# Altium footprint library hphonglib.PcbLib: 703 footprints (part 11 of 44)
Each footprint in its own frame and in the unit in brackets; x right, y up, seen from the top. Pads: shape width x height; smd on the part's side, far side on the other; paste and mask are expansions set on the pad; w line width, h text height; cw(c..) or ccw(c..) is an arc to the next point about the centre after c.
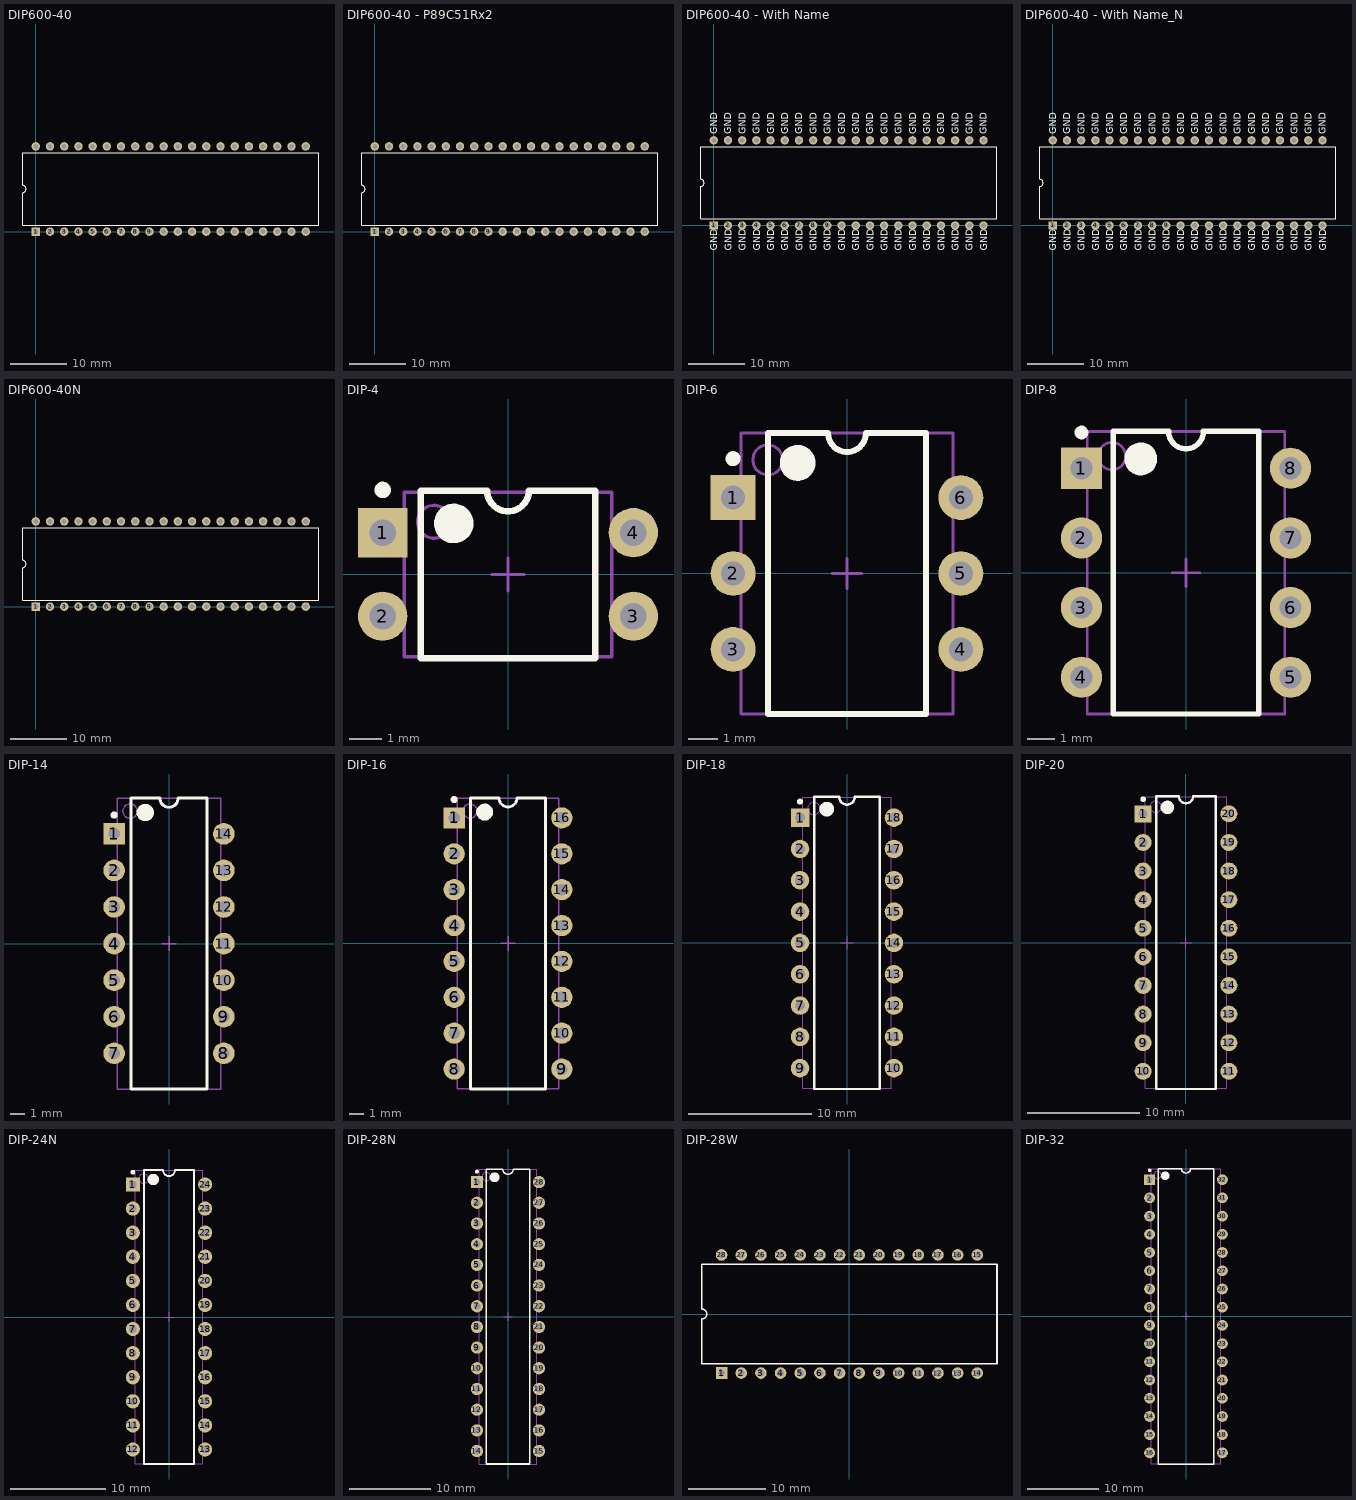
[diagram p10: the footprints below, top view; thin cyan lines are the x and y axes]

## DIP600-40 [mm] "DIP, Plastic; 40 Leads; Row Spacing 15.24 mm; Pitch 2.54 mm"
height 4.83
pads (40):
  rect 1.5x1.5 hole 0.9: 1(0,0)
  round 1.5 hole 0.9: 2(2.54,0) 3(5.08,0) 4(7.62,0) 5(10.16,0) 6(12.7,0) 7(15.24,0) 8(17.78,0) 9(20.32,0) 10(22.86,0) 11(25.4,0) 12(27.94,0) 13(30.48,0) 14(33.02,0) 15(35.56,0) 16(38.1,0) 17(40.64,0) 18(43.18,0) 19(45.72,0) 20(48.26,0) 21(48.26,15.24) 22(45.72,15.24) 23(43.18,15.24) 24(40.64,15.24) 25(38.1,15.24) 26(35.56,15.24) 27(33.02,15.24) 28(30.48,15.24) 29(27.94,15.24) 30(25.4,15.24) 31(22.86,15.24) 32(20.32,15.24) 33(17.78,15.24) 34(15.24,15.24) 35(12.7,15.24) 36(10.16,15.24) 37(7.62,15.24) 38(5.08,15.24) 39(2.54,15.24) 40(0,15.24)
Top Overlay:
  lines w0.2: -2.37,1.17 -2.37,6.985 ccw(c-2.37,7.62) -2.37,8.255 -2.37,14.07 50.63,14.07 50.63,1.17 -2.37,1.17
3D body: height 3, standoff 2.65, extent 6.87,13.54 8.37,15.24
3D body: height 3, standoff 0.5, extent 6.87,15.065 8.37,15.415
3D body: height 0.5, standoff -3.8, extent 7.345,15.065 7.895,15.415
3D body: height 3, standoff 2.65, extent 4.33,13.54 5.83,15.24
3D body: height 3, standoff 0.5, extent 4.33,15.065 5.83,15.415
3D body: height 0.5, standoff -3.8, extent 4.805,15.065 5.355,15.415
3D body: height 3, standoff 2.65, extent 1.79,13.54 3.29,15.24
3D body: height 3, standoff 0.5, extent 1.79,15.065 3.29,15.415
3D body: height 0.5, standoff -3.8, extent 2.265,15.065 2.815,15.415
3D body: height 3, standoff 2.65, extent -0.75,13.54 0.75,15.24
3D body: height 3, standoff 0.5, extent -0.75,15.065 0.75,15.415
3D body: height 0.5, standoff -3.8, extent -0.275,15.065 0.275,15.415
3D body: height 3, standoff 2.65, extent 17.03,13.54 18.53,15.24
3D body: height 3, standoff 0.5, extent 17.03,15.065 18.53,15.415
3D body: height 0.5, standoff -3.8, extent 17.505,15.065 18.055,15.415
3D body: height 3, standoff 2.65, extent 14.49,13.54 15.99,15.24
3D body: height 3, standoff 0.5, extent 14.49,15.065 15.99,15.415
3D body: height 0.5, standoff -3.8, extent 14.965,15.065 15.515,15.415
3D body: height 3, standoff 2.65, extent 11.95,13.54 13.45,15.24
3D body: height 3, standoff 0.5, extent 11.95,15.065 13.45,15.415
3D body: height 0.5, standoff -3.8, extent 12.425,15.065 12.975,15.415
3D body: height 3, standoff 2.65, extent 9.41,13.54 10.91,15.24
3D body: height 3, standoff 0.5, extent 9.41,15.065 10.91,15.415
3D body: height 0.5, standoff -3.8, extent 9.885,15.065 10.435,15.415
3D body: height 3, standoff 2.65, extent 27.19,13.54 28.69,15.24
3D body: height 3, standoff 0.5, extent 27.19,15.065 28.69,15.415
3D body: height 0.5, standoff -3.8, extent 27.665,15.065 28.215,15.415
3D body: height 3, standoff 2.65, extent 24.65,13.54 26.15,15.24
3D body: height 3, standoff 0.5, extent 24.65,15.065 26.15,15.415
3D body: height 0.5, standoff -3.8, extent 25.125,15.065 25.675,15.415
3D body: height 3, standoff 2.65, extent 22.11,13.54 23.61,15.24
3D body: height 3, standoff 0.5, extent 22.11,15.065 23.61,15.415
3D body: height 0.5, standoff -3.8, extent 22.585,15.065 23.135,15.415
3D body: height 3, standoff 2.65, extent 19.57,13.54 21.07,15.24
3D body: height 3, standoff 0.5, extent 19.57,15.065 21.07,15.415
3D body: height 0.5, standoff -3.8, extent 20.045,15.065 20.595,15.415
3D body: height 3, standoff 2.65, extent 37.35,13.54 38.85,15.24
3D body: height 3, standoff 0.5, extent 37.35,15.065 38.85,15.415
3D body: height 0.5, standoff -3.8, extent 37.825,15.065 38.375,15.415
3D body: height 3, standoff 2.65, extent 34.81,13.54 36.31,15.24
3D body: height 3, standoff 0.5, extent 34.81,15.065 36.31,15.415
3D body: height 0.5, standoff -3.8, extent 35.285,15.065 35.835,15.415
3D body: height 3, standoff 2.65, extent 32.27,13.54 33.77,15.24
3D body: height 3, standoff 0.5, extent 32.27,15.065 33.77,15.415
3D body: height 0.5, standoff -3.8, extent 32.745,15.065 33.295,15.415
3D body: height 3, standoff 2.65, extent 29.73,13.54 31.23,15.24
3D body: height 3, standoff 0.5, extent 29.73,15.065 31.23,15.415
3D body: height 0.5, standoff -3.8, extent 30.205,15.065 30.755,15.415
3D body: height 3, standoff 2.65, extent 47.51,13.54 49.01,15.24
3D body: height 3, standoff 0.5, extent 47.51,15.065 49.01,15.415
3D body: height 0.5, standoff -3.8, extent 47.985,15.065 48.535,15.415
3D body: height 3, standoff 2.65, extent 44.97,13.54 46.47,15.24
3D body: height 3, standoff 0.5, extent 44.97,15.065 46.47,15.415
3D body: height 0.5, standoff -3.8, extent 45.445,15.065 45.995,15.415
3D body: height 3, standoff 2.65, extent 42.43,13.54 43.93,15.24
3D body: height 3, standoff 0.5, extent 42.43,15.065 43.93,15.415
3D body: height 0.5, standoff -3.8, extent 42.905,15.065 43.455,15.415
3D body: height 3, standoff 2.65, extent 39.89,13.54 41.39,15.24
3D body: height 3, standoff 0.5, extent 39.89,15.065 41.39,15.415
3D body: height 0.5, standoff -3.8, extent 40.365,15.065 40.915,15.415
3D body: height 3, standoff 2.65, extent 39.89,0 41.39,1.7
3D body: height 3, standoff 0.5, extent 39.89,-0.175 41.39,0.175
3D body: height 0.5, standoff -3.8, extent 40.365,-0.175 40.915,0.175
3D body: height 3, standoff 2.65, extent 42.43,0 43.93,1.7
3D body: height 3, standoff 0.5, extent 42.43,-0.175 43.93,0.175
3D body: height 0.5, standoff -3.8, extent 42.905,-0.175 43.455,0.175
3D body: height 3, standoff 2.65, extent 44.97,0 46.47,1.7
3D body: height 3, standoff 0.5, extent 44.97,-0.175 46.47,0.175
3D body: height 0.5, standoff -3.8, extent 45.445,-0.175 45.995,0.175
3D body: height 3, standoff 2.65, extent 47.51,0 49.01,1.7
3D body: height 3, standoff 0.5, extent 47.51,-0.175 49.01,0.175
3D body: height 0.5, standoff -3.8, extent 47.985,-0.175 48.535,0.175
3D body: height 3, standoff 2.65, extent 29.73,0 31.23,1.7
3D body: height 3, standoff 0.5, extent 29.73,-0.175 31.23,0.175
3D body: height 0.5, standoff -3.8, extent 30.205,-0.175 30.755,0.175
3D body: height 3, standoff 2.65, extent 32.27,0 33.77,1.7
3D body: height 3, standoff 0.5, extent 32.27,-0.175 33.77,0.175
3D body: height 0.5, standoff -3.8, extent 32.745,-0.175 33.295,0.175
3D body: height 3, standoff 2.65, extent 34.81,0 36.31,1.7
3D body: height 3, standoff 0.5, extent 34.81,-0.175 36.31,0.175
3D body: height 0.5, standoff -3.8, extent 35.285,-0.175 35.835,0.175
3D body: height 3, standoff 2.65, extent 37.35,0 38.85,1.7
3D body: height 3, standoff 0.5, extent 37.35,-0.175 38.85,0.175
3D body: height 0.5, standoff -3.8, extent 37.825,-0.175 38.375,0.175
3D body: height 3, standoff 2.65, extent 19.57,0 21.07,1.7
3D body: height 3, standoff 0.5, extent 19.57,-0.175 21.07,0.175
3D body: height 0.5, standoff -3.8, extent 20.045,-0.175 20.595,0.175
3D body: height 3, standoff 2.65, extent 22.11,0 23.61,1.7
3D body: height 3, standoff 0.5, extent 22.11,-0.175 23.61,0.175
3D body: height 0.5, standoff -3.8, extent 22.585,-0.175 23.135,0.175
3D body: height 3, standoff 2.65, extent 24.65,0 26.15,1.7
3D body: height 3, standoff 0.5, extent 24.65,-0.175 26.15,0.175
3D body: height 0.5, standoff -3.8, extent 25.125,-0.175 25.675,0.175
3D body: height 3, standoff 2.65, extent 27.19,0 28.69,1.7
3D body: height 3, standoff 0.5, extent 27.19,-0.175 28.69,0.175
3D body: height 0.5, standoff -3.8, extent 27.665,-0.175 28.215,0.175
3D body: height 3, standoff 2.65, extent 9.41,0 10.91,1.7
3D body: height 3, standoff 0.5, extent 9.41,-0.175 10.91,0.175
3D body: height 0.5, standoff -3.8, extent 9.885,-0.175 10.435,0.175
3D body: height 3, standoff 2.65, extent 11.95,0 13.45,1.7
3D body: height 3, standoff 0.5, extent 11.95,-0.175 13.45,0.175
3D body: height 0.5, standoff -3.8, extent 12.425,-0.175 12.975,0.175
3D body: height 3, standoff 2.65, extent 14.49,0 15.99,1.7
3D body: height 3, standoff 0.5, extent 14.49,-0.175 15.99,0.175
3D body: height 0.5, standoff -3.8, extent 14.965,-0.175 15.515,0.175
3D body: height 3, standoff 2.65, extent 17.03,0 18.53,1.7
3D body: height 3, standoff 0.5, extent 17.03,-0.175 18.53,0.175
3D body: height 0.5, standoff -3.8, extent 17.505,-0.175 18.055,0.175
3D body: height 0.5, standoff -3.8, extent 7.345,-0.175 7.895,0.175
3D body: height 3, standoff 0.5, extent 6.87,-0.175 8.37,0.175
3D body: height 3, standoff 2.65, extent 6.87,0 8.37,1.7
3D body: height 0.5, standoff -3.8, extent 4.805,-0.175 5.355,0.175
3D body: height 3, standoff 0.5, extent 4.33,-0.175 5.83,0.175
3D body: height 3, standoff 2.65, extent 4.33,0 5.83,1.7
3D body: height 0.5, standoff -3.8, extent 2.265,-0.175 2.815,0.175
3D body: height 3, standoff 0.5, extent 1.79,-0.175 3.29,0.175
3D body: height 3, standoff 2.65, extent 1.79,0 3.29,1.7
3D body: height 0.5, standoff -3.8, extent -0.275,-0.175 0.275,0.175
3D body: height 3, standoff 0.5, extent -0.75,-0.175 0.75,0.175
3D body: height 3, standoff 2.65, extent -0.75,0 0.75,1.7
3D body: height 5.3, standoff 0.3, extent -2.3,1.25 50.65,14
3D body: height 5.4, standoff 4, extent -2.325,6.621 -1.316,8.638

## DIP600-40 - P89C51Rx2 [mm] "DIP, Plastic; 40 Leads; Row Spacing 15.24 mm; Pitch 2.54 mm"
height 4.83
pads (40):
  rect 1.5x1.5 hole 0.9: 1(0,0)
  round 1.5 hole 0.9: 2(2.54,0) 3(5.08,0) 4(7.62,0) 5(10.16,0) 6(12.7,0) 7(15.24,0) 8(17.78,0) 9(20.32,0) 10(22.86,0) 11(25.4,0) 12(27.94,0) 13(30.48,0) 14(33.02,0) 15(35.56,0) 16(38.1,0) 17(40.64,0) 18(43.18,0) 19(45.72,0) 20(48.26,0) 21(48.26,15.24) 22(45.72,15.24) 23(43.18,15.24) 24(40.64,15.24) 25(38.1,15.24) 26(35.56,15.24) 27(33.02,15.24) 28(30.48,15.24) 29(27.94,15.24) 30(25.4,15.24) 31(22.86,15.24) 32(20.32,15.24) 33(17.78,15.24) 34(15.24,15.24) 35(12.7,15.24) 36(10.16,15.24) 37(7.62,15.24) 38(5.08,15.24) 39(2.54,15.24) 40(0,15.24)
Top Overlay:
  lines w0.2: -2.37,1.17 -2.37,6.985 ccw(c-2.37,7.62) -2.37,8.255 -2.37,14.07 50.63,14.07 50.63,1.17 -2.37,1.17
3D body: height 3, standoff 2.65, extent 6.87,13.54 8.37,15.24
3D body: height 3, standoff 0.5, extent 6.87,15.065 8.37,15.415
3D body: height 0.5, standoff -3.8, extent 7.345,15.065 7.895,15.415
3D body: height 3, standoff 2.65, extent 4.33,13.54 5.83,15.24
3D body: height 3, standoff 0.5, extent 4.33,15.065 5.83,15.415
3D body: height 0.5, standoff -3.8, extent 4.805,15.065 5.355,15.415
3D body: height 3, standoff 2.65, extent 1.79,13.54 3.29,15.24
3D body: height 3, standoff 0.5, extent 1.79,15.065 3.29,15.415
3D body: height 0.5, standoff -3.8, extent 2.265,15.065 2.815,15.415
3D body: height 3, standoff 2.65, extent -0.75,13.54 0.75,15.24
3D body: height 3, standoff 0.5, extent -0.75,15.065 0.75,15.415
3D body: height 0.5, standoff -3.8, extent -0.275,15.065 0.275,15.415
3D body: height 3, standoff 2.65, extent 17.03,13.54 18.53,15.24
3D body: height 3, standoff 0.5, extent 17.03,15.065 18.53,15.415
3D body: height 0.5, standoff -3.8, extent 17.505,15.065 18.055,15.415
3D body: height 3, standoff 2.65, extent 14.49,13.54 15.99,15.24
3D body: height 3, standoff 0.5, extent 14.49,15.065 15.99,15.415
3D body: height 0.5, standoff -3.8, extent 14.965,15.065 15.515,15.415
3D body: height 3, standoff 2.65, extent 11.95,13.54 13.45,15.24
3D body: height 3, standoff 0.5, extent 11.95,15.065 13.45,15.415
3D body: height 0.5, standoff -3.8, extent 12.425,15.065 12.975,15.415
3D body: height 3, standoff 2.65, extent 9.41,13.54 10.91,15.24
3D body: height 3, standoff 0.5, extent 9.41,15.065 10.91,15.415
3D body: height 0.5, standoff -3.8, extent 9.885,15.065 10.435,15.415
3D body: height 3, standoff 2.65, extent 27.19,13.54 28.69,15.24
3D body: height 3, standoff 0.5, extent 27.19,15.065 28.69,15.415
3D body: height 0.5, standoff -3.8, extent 27.665,15.065 28.215,15.415
3D body: height 3, standoff 2.65, extent 24.65,13.54 26.15,15.24
3D body: height 3, standoff 0.5, extent 24.65,15.065 26.15,15.415
3D body: height 0.5, standoff -3.8, extent 25.125,15.065 25.675,15.415
3D body: height 3, standoff 2.65, extent 22.11,13.54 23.61,15.24
3D body: height 3, standoff 0.5, extent 22.11,15.065 23.61,15.415
3D body: height 0.5, standoff -3.8, extent 22.585,15.065 23.135,15.415
3D body: height 3, standoff 2.65, extent 19.57,13.54 21.07,15.24
3D body: height 3, standoff 0.5, extent 19.57,15.065 21.07,15.415
3D body: height 0.5, standoff -3.8, extent 20.045,15.065 20.595,15.415
3D body: height 3, standoff 2.65, extent 37.35,13.54 38.85,15.24
3D body: height 3, standoff 0.5, extent 37.35,15.065 38.85,15.415
3D body: height 0.5, standoff -3.8, extent 37.825,15.065 38.375,15.415
3D body: height 3, standoff 2.65, extent 34.81,13.54 36.31,15.24
3D body: height 3, standoff 0.5, extent 34.81,15.065 36.31,15.415
3D body: height 0.5, standoff -3.8, extent 35.285,15.065 35.835,15.415
3D body: height 3, standoff 2.65, extent 32.27,13.54 33.77,15.24
3D body: height 3, standoff 0.5, extent 32.27,15.065 33.77,15.415
3D body: height 0.5, standoff -3.8, extent 32.745,15.065 33.295,15.415
3D body: height 3, standoff 2.65, extent 29.73,13.54 31.23,15.24
3D body: height 3, standoff 0.5, extent 29.73,15.065 31.23,15.415
3D body: height 0.5, standoff -3.8, extent 30.205,15.065 30.755,15.415
3D body: height 3, standoff 2.65, extent 47.51,13.54 49.01,15.24
3D body: height 3, standoff 0.5, extent 47.51,15.065 49.01,15.415
3D body: height 0.5, standoff -3.8, extent 47.985,15.065 48.535,15.415
3D body: height 3, standoff 2.65, extent 44.97,13.54 46.47,15.24
3D body: height 3, standoff 0.5, extent 44.97,15.065 46.47,15.415
3D body: height 0.5, standoff -3.8, extent 45.445,15.065 45.995,15.415
3D body: height 3, standoff 2.65, extent 42.43,13.54 43.93,15.24
3D body: height 3, standoff 0.5, extent 42.43,15.065 43.93,15.415
3D body: height 0.5, standoff -3.8, extent 42.905,15.065 43.455,15.415
3D body: height 3, standoff 2.65, extent 39.89,13.54 41.39,15.24
3D body: height 3, standoff 0.5, extent 39.89,15.065 41.39,15.415
3D body: height 0.5, standoff -3.8, extent 40.365,15.065 40.915,15.415
3D body: height 3, standoff 2.65, extent 39.89,0 41.39,1.7
3D body: height 3, standoff 0.5, extent 39.89,-0.175 41.39,0.175
3D body: height 0.5, standoff -3.8, extent 40.365,-0.175 40.915,0.175
3D body: height 3, standoff 2.65, extent 42.43,0 43.93,1.7
3D body: height 3, standoff 0.5, extent 42.43,-0.175 43.93,0.175
3D body: height 0.5, standoff -3.8, extent 42.905,-0.175 43.455,0.175
3D body: height 3, standoff 2.65, extent 44.97,0 46.47,1.7
3D body: height 3, standoff 0.5, extent 44.97,-0.175 46.47,0.175
3D body: height 0.5, standoff -3.8, extent 45.445,-0.175 45.995,0.175
3D body: height 3, standoff 2.65, extent 47.51,0 49.01,1.7
3D body: height 3, standoff 0.5, extent 47.51,-0.175 49.01,0.175
3D body: height 0.5, standoff -3.8, extent 47.985,-0.175 48.535,0.175
3D body: height 3, standoff 2.65, extent 29.73,0 31.23,1.7
3D body: height 3, standoff 0.5, extent 29.73,-0.175 31.23,0.175
3D body: height 0.5, standoff -3.8, extent 30.205,-0.175 30.755,0.175
3D body: height 3, standoff 2.65, extent 32.27,0 33.77,1.7
3D body: height 3, standoff 0.5, extent 32.27,-0.175 33.77,0.175
3D body: height 0.5, standoff -3.8, extent 32.745,-0.175 33.295,0.175
3D body: height 3, standoff 2.65, extent 34.81,0 36.31,1.7
3D body: height 3, standoff 0.5, extent 34.81,-0.175 36.31,0.175
3D body: height 0.5, standoff -3.8, extent 35.285,-0.175 35.835,0.175
3D body: height 3, standoff 2.65, extent 37.35,0 38.85,1.7
3D body: height 3, standoff 0.5, extent 37.35,-0.175 38.85,0.175
3D body: height 0.5, standoff -3.8, extent 37.825,-0.175 38.375,0.175
3D body: height 3, standoff 2.65, extent 19.57,0 21.07,1.7
3D body: height 3, standoff 0.5, extent 19.57,-0.175 21.07,0.175
3D body: height 0.5, standoff -3.8, extent 20.045,-0.175 20.595,0.175
3D body: height 3, standoff 2.65, extent 22.11,0 23.61,1.7
3D body: height 3, standoff 0.5, extent 22.11,-0.175 23.61,0.175
3D body: height 0.5, standoff -3.8, extent 22.585,-0.175 23.135,0.175
3D body: height 3, standoff 2.65, extent 24.65,0 26.15,1.7
3D body: height 3, standoff 0.5, extent 24.65,-0.175 26.15,0.175
3D body: height 0.5, standoff -3.8, extent 25.125,-0.175 25.675,0.175
3D body: height 3, standoff 2.65, extent 27.19,0 28.69,1.7
3D body: height 3, standoff 0.5, extent 27.19,-0.175 28.69,0.175
3D body: height 0.5, standoff -3.8, extent 27.665,-0.175 28.215,0.175
3D body: height 3, standoff 2.65, extent 9.41,0 10.91,1.7
3D body: height 3, standoff 0.5, extent 9.41,-0.175 10.91,0.175
3D body: height 0.5, standoff -3.8, extent 9.885,-0.175 10.435,0.175
3D body: height 3, standoff 2.65, extent 11.95,0 13.45,1.7
3D body: height 3, standoff 0.5, extent 11.95,-0.175 13.45,0.175
3D body: height 0.5, standoff -3.8, extent 12.425,-0.175 12.975,0.175
3D body: height 3, standoff 2.65, extent 14.49,0 15.99,1.7
3D body: height 3, standoff 0.5, extent 14.49,-0.175 15.99,0.175
3D body: height 0.5, standoff -3.8, extent 14.965,-0.175 15.515,0.175
3D body: height 3, standoff 2.65, extent 17.03,0 18.53,1.7
3D body: height 3, standoff 0.5, extent 17.03,-0.175 18.53,0.175
3D body: height 0.5, standoff -3.8, extent 17.505,-0.175 18.055,0.175
3D body: height 0.5, standoff -3.8, extent 7.345,-0.175 7.895,0.175
3D body: height 3, standoff 0.5, extent 6.87,-0.175 8.37,0.175
3D body: height 3, standoff 2.65, extent 6.87,0 8.37,1.7
3D body: height 0.5, standoff -3.8, extent 4.805,-0.175 5.355,0.175
3D body: height 3, standoff 0.5, extent 4.33,-0.175 5.83,0.175
3D body: height 3, standoff 2.65, extent 4.33,0 5.83,1.7
3D body: height 0.5, standoff -3.8, extent 2.265,-0.175 2.815,0.175
3D body: height 3, standoff 0.5, extent 1.79,-0.175 3.29,0.175
3D body: height 3, standoff 2.65, extent 1.79,0 3.29,1.7
3D body: height 0.5, standoff -3.8, extent -0.275,-0.175 0.275,0.175
3D body: height 3, standoff 0.5, extent -0.75,-0.175 0.75,0.175
3D body: height 3, standoff 2.65, extent -0.75,0 0.75,1.7
3D body: height 5.3, standoff 0.3, extent -2.3,1.25 50.65,14
3D body: height 5.4, standoff 4, extent -2.325,6.621 -1.316,8.638

## DIP600-40 - With Name [mm] "DIP, Plastic; 40 Leads; Row Spacing 15.24 mm; Pitch 2.54 mm"
height 4.83
pads (40):
  rect 1.5x1.5 hole 0.9: 1(0,0)
  round 1.5 hole 0.9: 2(2.54,0) 3(5.08,0) 4(7.62,0) 5(10.16,0) 6(12.7,0) 7(15.24,0) 8(17.78,0) 9(20.32,0) 10(22.86,0) 11(25.4,0) 12(27.94,0) 13(30.48,0) 14(33.02,0) 15(35.56,0) 16(38.1,0) 17(40.64,0) 18(43.18,0) 19(45.72,0) 20(48.26,0) 21(48.26,15.24) 22(45.72,15.24) 23(43.18,15.24) 24(40.64,15.24) 25(38.1,15.24) 26(35.56,15.24) 27(33.02,15.24) 28(30.48,15.24) 29(27.94,15.24) 30(25.4,15.24) 31(22.86,15.24) 32(20.32,15.24) 33(17.78,15.24) 34(15.24,15.24) 35(12.7,15.24) 36(10.16,15.24) 37(7.62,15.24) 38(5.08,15.24) 39(2.54,15.24) 40(0,15.24)
Top Overlay:
  lines w0.2: -2.37,1.17 -2.37,6.985 ccw(c-2.37,7.62) -2.37,8.255 -2.37,14.07 50.63,14.07 50.63,1.17 -2.37,1.17
  text "GND" at 31.13,-4.565 h1.27
  text "GND" at 33.67,-4.565 h1.27
  text "GND" at 38.75,-4.565 h1.27
  text "GND" at 36.21,-4.565 h1.27
  text "GND" at 41.29,-4.565 h1.27
  text "GND" at 43.83,-4.565 h1.27
  text "GND" at 48.91,-4.565 h1.27
  text "GND" at 46.37,-4.565 h1.27
  text "GND" at 20.97,-4.565 h1.27
  text "GND" at 23.51,-4.565 h1.27
  text "GND" at 28.59,-4.565 h1.27
  text "GND" at 26.05,-4.565 h1.27
  text "GND" at 10.81,-4.565 h1.27
  text "GND" at 13.35,-4.565 h1.27
  text "GND" at 18.43,-4.565 h1.27
  text "GND" at 15.89,-4.565 h1.27
  text "GND" at 0.65,-4.565 h1.27
  text "GND" at 3.19,-4.565 h1.27
  text "GND" at 8.27,-4.565 h1.27
  text "GND" at 5.73,-4.565 h1.27
  text "GND" at 41.265,16.35 h1.27
  text "GND" at 43.805,16.35 h1.27
  text "GND" at 48.885,16.35 h1.27
  text "GND" at 46.345,16.35 h1.27
  text "GND" at 31.105,16.35 h1.27
  text "GND" at 33.645,16.35 h1.27
  text "GND" at 38.725,16.35 h1.27
  text "GND" at 36.185,16.35 h1.27
  text "GND" at 20.945,16.35 h1.27
  text "GND" at 23.485,16.35 h1.27
  text "GND" at 28.565,16.35 h1.27
  text "GND" at 26.025,16.35 h1.27
  text "GND" at 10.785,16.35 h1.27
  text "GND" at 13.325,16.35 h1.27
  text "GND" at 18.405,16.35 h1.27
  text "GND" at 15.865,16.35 h1.27
  text "GND" at 5.705,16.35 h1.27
  text "GND" at 8.245,16.35 h1.27
  text "GND" at 3.165,16.35 h1.27
  text "GND" at 0.625,16.35 h1.27
Bottom Overlay:
  lines w0.254: -2.525,-1.025 -2.525,16.35 50.675,16.35 50.675,-1.025 -2.525,-1.025
  text "GND" at 1.955,-4.85 h1.27
  text "GND" at -0.585,-4.85 h1.27
  text "GND" at 9.575,-4.85 h1.27
  text "GND" at 7.035,-4.85 h1.27
  text "GND" at 4.495,-4.85 h1.27
  text "GND" at 17.195,-4.85 h1.27
  text "GND" at 14.655,-4.85 h1.27
  text "GND" at 12.115,-4.85 h1.27
  text "GND" at 24.815,-4.85 h1.27
  text "GND" at 22.275,-4.85 h1.27
  text "GND" at 19.735,-4.85 h1.27
  text "GND" at 32.435,-4.85 h1.27
  text "GND" at 29.895,-4.85 h1.27
  text "GND" at 27.355,-4.85 h1.27
  text "GND" at 40.055,-4.85 h1.27
  text "GND" at 37.515,-4.85 h1.27
  text "GND" at 34.975,-4.85 h1.27
  text "GND" at 42.595,-4.85 h1.27
  text "GND" at 45.135,-4.85 h1.27
  text "GND" at 47.675,-4.85 h1.27
  text "GND" at 46.325,20.15 h1.27
  text "GND" at 48.825,20.125 h1.27
  text "GND" at 38.65,20.15 h1.27
  text "GND" at 41.19,20.15 h1.27
  text "GND" at 43.73,20.15 h1.27
  text "GND" at 31.03,20.15 h1.27
  text "GND" at 33.57,20.15 h1.27
  text "GND" at 36.11,20.15 h1.27
  text "GND" at 23.41,20.15 h1.27
  text "GND" at 25.95,20.15 h1.27
  text "GND" at 28.49,20.15 h1.27
  text "GND" at 15.79,20.15 h1.27
  text "GND" at 18.33,20.15 h1.27
  text "GND" at 20.87,20.15 h1.27
  text "GND" at 8.17,20.15 h1.27
  text "GND" at 10.71,20.15 h1.27
  text "GND" at 13.25,20.15 h1.27
  text "GND" at 5.63,20.15 h1.27
  text "GND" at 3.09,20.15 h1.27
  text "GND" at 0.55,20.15 h1.27
3D body: height 3, standoff 2.65, extent 6.87,13.54 8.37,15.24
3D body: height 3, standoff 0.5, extent 6.87,15.065 8.37,15.415
3D body: height 0.5, standoff -3.8, extent 7.345,15.065 7.895,15.415
3D body: height 3, standoff 2.65, extent 4.33,13.54 5.83,15.24
3D body: height 3, standoff 0.5, extent 4.33,15.065 5.83,15.415
3D body: height 0.5, standoff -3.8, extent 4.805,15.065 5.355,15.415
3D body: height 3, standoff 2.65, extent 1.79,13.54 3.29,15.24
3D body: height 3, standoff 0.5, extent 1.79,15.065 3.29,15.415
3D body: height 0.5, standoff -3.8, extent 2.265,15.065 2.815,15.415
3D body: height 3, standoff 2.65, extent -0.75,13.54 0.75,15.24
3D body: height 3, standoff 0.5, extent -0.75,15.065 0.75,15.415
3D body: height 0.5, standoff -3.8, extent -0.275,15.065 0.275,15.415
3D body: height 3, standoff 2.65, extent 17.03,13.54 18.53,15.24
3D body: height 3, standoff 0.5, extent 17.03,15.065 18.53,15.415
3D body: height 0.5, standoff -3.8, extent 17.505,15.065 18.055,15.415
3D body: height 3, standoff 2.65, extent 14.49,13.54 15.99,15.24
3D body: height 3, standoff 0.5, extent 14.49,15.065 15.99,15.415
3D body: height 0.5, standoff -3.8, extent 14.965,15.065 15.515,15.415
3D body: height 3, standoff 2.65, extent 11.95,13.54 13.45,15.24
3D body: height 3, standoff 0.5, extent 11.95,15.065 13.45,15.415
3D body: height 0.5, standoff -3.8, extent 12.425,15.065 12.975,15.415
3D body: height 3, standoff 2.65, extent 9.41,13.54 10.91,15.24
3D body: height 3, standoff 0.5, extent 9.41,15.065 10.91,15.415
3D body: height 0.5, standoff -3.8, extent 9.885,15.065 10.435,15.415
3D body: height 3, standoff 2.65, extent 27.19,13.54 28.69,15.24
3D body: height 3, standoff 0.5, extent 27.19,15.065 28.69,15.415
3D body: height 0.5, standoff -3.8, extent 27.665,15.065 28.215,15.415
3D body: height 3, standoff 2.65, extent 24.65,13.54 26.15,15.24
3D body: height 3, standoff 0.5, extent 24.65,15.065 26.15,15.415
3D body: height 0.5, standoff -3.8, extent 25.125,15.065 25.675,15.415
3D body: height 3, standoff 2.65, extent 22.11,13.54 23.61,15.24
3D body: height 3, standoff 0.5, extent 22.11,15.065 23.61,15.415
3D body: height 0.5, standoff -3.8, extent 22.585,15.065 23.135,15.415
3D body: height 3, standoff 2.65, extent 19.57,13.54 21.07,15.24
3D body: height 3, standoff 0.5, extent 19.57,15.065 21.07,15.415
3D body: height 0.5, standoff -3.8, extent 20.045,15.065 20.595,15.415
3D body: height 3, standoff 2.65, extent 37.35,13.54 38.85,15.24
3D body: height 3, standoff 0.5, extent 37.35,15.065 38.85,15.415
3D body: height 0.5, standoff -3.8, extent 37.825,15.065 38.375,15.415
3D body: height 3, standoff 2.65, extent 34.81,13.54 36.31,15.24
3D body: height 3, standoff 0.5, extent 34.81,15.065 36.31,15.415
3D body: height 0.5, standoff -3.8, extent 35.285,15.065 35.835,15.415
3D body: height 3, standoff 2.65, extent 32.27,13.54 33.77,15.24
3D body: height 3, standoff 0.5, extent 32.27,15.065 33.77,15.415
3D body: height 0.5, standoff -3.8, extent 32.745,15.065 33.295,15.415
3D body: height 3, standoff 2.65, extent 29.73,13.54 31.23,15.24
3D body: height 3, standoff 0.5, extent 29.73,15.065 31.23,15.415
3D body: height 0.5, standoff -3.8, extent 30.205,15.065 30.755,15.415
3D body: height 3, standoff 2.65, extent 47.51,13.54 49.01,15.24
3D body: height 3, standoff 0.5, extent 47.51,15.065 49.01,15.415
3D body: height 0.5, standoff -3.8, extent 47.985,15.065 48.535,15.415
3D body: height 3, standoff 2.65, extent 44.97,13.54 46.47,15.24
3D body: height 3, standoff 0.5, extent 44.97,15.065 46.47,15.415
3D body: height 0.5, standoff -3.8, extent 45.445,15.065 45.995,15.415
3D body: height 3, standoff 2.65, extent 42.43,13.54 43.93,15.24
3D body: height 3, standoff 0.5, extent 42.43,15.065 43.93,15.415
3D body: height 0.5, standoff -3.8, extent 42.905,15.065 43.455,15.415
3D body: height 3, standoff 2.65, extent 39.89,13.54 41.39,15.24
3D body: height 3, standoff 0.5, extent 39.89,15.065 41.39,15.415
3D body: height 0.5, standoff -3.8, extent 40.365,15.065 40.915,15.415
3D body: height 3, standoff 2.65, extent 39.89,0 41.39,1.7
3D body: height 3, standoff 0.5, extent 39.89,-0.175 41.39,0.175
3D body: height 0.5, standoff -3.8, extent 40.365,-0.175 40.915,0.175
3D body: height 3, standoff 2.65, extent 42.43,0 43.93,1.7
3D body: height 3, standoff 0.5, extent 42.43,-0.175 43.93,0.175
3D body: height 0.5, standoff -3.8, extent 42.905,-0.175 43.455,0.175
3D body: height 3, standoff 2.65, extent 44.97,0 46.47,1.7
3D body: height 3, standoff 0.5, extent 44.97,-0.175 46.47,0.175
3D body: height 0.5, standoff -3.8, extent 45.445,-0.175 45.995,0.175
3D body: height 3, standoff 2.65, extent 47.51,0 49.01,1.7
3D body: height 3, standoff 0.5, extent 47.51,-0.175 49.01,0.175
3D body: height 0.5, standoff -3.8, extent 47.985,-0.175 48.535,0.175
3D body: height 3, standoff 2.65, extent 29.73,0 31.23,1.7
3D body: height 3, standoff 0.5, extent 29.73,-0.175 31.23,0.175
3D body: height 0.5, standoff -3.8, extent 30.205,-0.175 30.755,0.175
3D body: height 3, standoff 2.65, extent 32.27,0 33.77,1.7
3D body: height 3, standoff 0.5, extent 32.27,-0.175 33.77,0.175
3D body: height 0.5, standoff -3.8, extent 32.745,-0.175 33.295,0.175
3D body: height 3, standoff 2.65, extent 34.81,0 36.31,1.7
3D body: height 3, standoff 0.5, extent 34.81,-0.175 36.31,0.175
3D body: height 0.5, standoff -3.8, extent 35.285,-0.175 35.835,0.175
3D body: height 3, standoff 2.65, extent 37.35,0 38.85,1.7
3D body: height 3, standoff 0.5, extent 37.35,-0.175 38.85,0.175
3D body: height 0.5, standoff -3.8, extent 37.825,-0.175 38.375,0.175
3D body: height 3, standoff 2.65, extent 19.57,0 21.07,1.7
3D body: height 3, standoff 0.5, extent 19.57,-0.175 21.07,0.175
3D body: height 0.5, standoff -3.8, extent 20.045,-0.175 20.595,0.175
3D body: height 3, standoff 2.65, extent 22.11,0 23.61,1.7
3D body: height 3, standoff 0.5, extent 22.11,-0.175 23.61,0.175
3D body: height 0.5, standoff -3.8, extent 22.585,-0.175 23.135,0.175
3D body: height 3, standoff 2.65, extent 24.65,0 26.15,1.7
3D body: height 3, standoff 0.5, extent 24.65,-0.175 26.15,0.175
3D body: height 0.5, standoff -3.8, extent 25.125,-0.175 25.675,0.175
3D body: height 3, standoff 2.65, extent 27.19,0 28.69,1.7
3D body: height 3, standoff 0.5, extent 27.19,-0.175 28.69,0.175
3D body: height 0.5, standoff -3.8, extent 27.665,-0.175 28.215,0.175
3D body: height 3, standoff 2.65, extent 9.41,0 10.91,1.7
3D body: height 3, standoff 0.5, extent 9.41,-0.175 10.91,0.175
3D body: height 0.5, standoff -3.8, extent 9.885,-0.175 10.435,0.175
3D body: height 3, standoff 2.65, extent 11.95,0 13.45,1.7
3D body: height 3, standoff 0.5, extent 11.95,-0.175 13.45,0.175
3D body: height 0.5, standoff -3.8, extent 12.425,-0.175 12.975,0.175
3D body: height 3, standoff 2.65, extent 14.49,0 15.99,1.7
3D body: height 3, standoff 0.5, extent 14.49,-0.175 15.99,0.175
3D body: height 0.5, standoff -3.8, extent 14.965,-0.175 15.515,0.175
3D body: height 3, standoff 2.65, extent 17.03,0 18.53,1.7
3D body: height 3, standoff 0.5, extent 17.03,-0.175 18.53,0.175
3D body: height 0.5, standoff -3.8, extent 17.505,-0.175 18.055,0.175
3D body: height 0.5, standoff -3.8, extent 7.345,-0.175 7.895,0.175
3D body: height 3, standoff 0.5, extent 6.87,-0.175 8.37,0.175
3D body: height 3, standoff 2.65, extent 6.87,0 8.37,1.7
3D body: height 0.5, standoff -3.8, extent 4.805,-0.175 5.355,0.175
3D body: height 3, standoff 0.5, extent 4.33,-0.175 5.83,0.175
3D body: height 3, standoff 2.65, extent 4.33,0 5.83,1.7
3D body: height 0.5, standoff -3.8, extent 2.265,-0.175 2.815,0.175
3D body: height 3, standoff 0.5, extent 1.79,-0.175 3.29,0.175
3D body: height 3, standoff 2.65, extent 1.79,0 3.29,1.7
3D body: height 0.5, standoff -3.8, extent -0.275,-0.175 0.275,0.175
3D body: height 3, standoff 0.5, extent -0.75,-0.175 0.75,0.175
3D body: height 3, standoff 2.65, extent -0.75,0 0.75,1.7
3D body: height 5.3, standoff 0.3, extent -2.3,1.25 50.65,14
3D body: height 5.4, standoff 4, extent -2.325,6.621 -1.316,8.638

## DIP600-40 - With Name_N [mm] "DIP, Plastic; 40 Leads; Row Spacing 15.24 mm; Pitch 2.54 mm"
height 4.83
pads (40):
  rect 1.5x1.5 hole 0.9: 1(0,0)
  round 1.5 hole 0.9: 2(2.54,0) 3(5.08,0) 4(7.62,0) 5(10.16,0) 6(12.7,0) 7(15.24,0) 8(17.78,0) 9(20.32,0) 10(22.86,0) 11(25.4,0) 12(27.94,0) 13(30.48,0) 14(33.02,0) 15(35.56,0) 16(38.1,0) 17(40.64,0) 18(43.18,0) 19(45.72,0) 20(48.26,0) 21(48.26,15.24) 22(45.72,15.24) 23(43.18,15.24) 24(40.64,15.24) 25(38.1,15.24) 26(35.56,15.24) 27(33.02,15.24) 28(30.48,15.24) 29(27.94,15.24) 30(25.4,15.24) 31(22.86,15.24) 32(20.32,15.24) 33(17.78,15.24) 34(15.24,15.24) 35(12.7,15.24) 36(10.16,15.24) 37(7.62,15.24) 38(5.08,15.24) 39(2.54,15.24) 40(0,15.24)
Top Overlay:
  lines w0.2: -2.37,1.17 -2.37,6.985 ccw(c-2.37,7.62) -2.37,8.255 -2.37,14.07 50.63,14.07 50.63,1.17 -2.37,1.17
  text "GND" at 31.13,-4.565 h1.27
  text "GND" at 33.67,-4.565 h1.27
  text "GND" at 38.75,-4.565 h1.27
  text "GND" at 36.21,-4.565 h1.27
  text "GND" at 41.29,-4.565 h1.27
  text "GND" at 43.83,-4.565 h1.27
  text "GND" at 48.91,-4.565 h1.27
  text "GND" at 46.37,-4.565 h1.27
  text "GND" at 20.97,-4.565 h1.27
  text "GND" at 23.51,-4.565 h1.27
  text "GND" at 28.59,-4.565 h1.27
  text "GND" at 26.05,-4.565 h1.27
  text "GND" at 10.81,-4.565 h1.27
  text "GND" at 13.35,-4.565 h1.27
  text "GND" at 18.43,-4.565 h1.27
  text "GND" at 15.89,-4.565 h1.27
  text "GND" at 0.65,-4.565 h1.27
  text "GND" at 3.19,-4.565 h1.27
  text "GND" at 8.27,-4.565 h1.27
  text "GND" at 5.73,-4.565 h1.27
  text "GND" at 41.265,16.35 h1.27
  text "GND" at 43.805,16.35 h1.27
  text "GND" at 48.885,16.35 h1.27
  text "GND" at 46.345,16.35 h1.27
  text "GND" at 31.105,16.35 h1.27
  text "GND" at 33.645,16.35 h1.27
  text "GND" at 38.725,16.35 h1.27
  text "GND" at 36.185,16.35 h1.27
  text "GND" at 20.945,16.35 h1.27
  text "GND" at 23.485,16.35 h1.27
  text "GND" at 28.565,16.35 h1.27
  text "GND" at 26.025,16.35 h1.27
  text "GND" at 10.785,16.35 h1.27
  text "GND" at 13.325,16.35 h1.27
  text "GND" at 18.405,16.35 h1.27
  text "GND" at 15.865,16.35 h1.27
  text "GND" at 5.705,16.35 h1.27
  text "GND" at 8.245,16.35 h1.27
  text "GND" at 3.165,16.35 h1.27
  text "GND" at 0.625,16.35 h1.27
Bottom Overlay:
  lines w0.254: -2.525,-1.025 -2.525,16.35 50.675,16.35 50.675,-1.025 -2.525,-1.025
  text "GND" at 1.955,-4.85 h1.27
  text "GND" at -0.585,-4.85 h1.27
  text "GND" at 9.575,-4.85 h1.27
  text "GND" at 7.035,-4.85 h1.27
  text "GND" at 4.495,-4.85 h1.27
  text "GND" at 17.195,-4.85 h1.27
  text "GND" at 14.655,-4.85 h1.27
  text "GND" at 12.115,-4.85 h1.27
  text "GND" at 24.815,-4.85 h1.27
  text "GND" at 22.275,-4.85 h1.27
  text "GND" at 19.735,-4.85 h1.27
  text "GND" at 32.435,-4.85 h1.27
  text "GND" at 29.895,-4.85 h1.27
  text "GND" at 27.355,-4.85 h1.27
  text "GND" at 40.055,-4.85 h1.27
  text "GND" at 37.515,-4.85 h1.27
  text "GND" at 34.975,-4.85 h1.27
  text "GND" at 42.595,-4.85 h1.27
  text "GND" at 45.135,-4.85 h1.27
  text "GND" at 47.675,-4.85 h1.27
  text "GND" at 46.325,20.15 h1.27
  text "GND" at 48.825,20.125 h1.27
  text "GND" at 38.65,20.15 h1.27
  text "GND" at 41.19,20.15 h1.27
  text "GND" at 43.73,20.15 h1.27
  text "GND" at 31.03,20.15 h1.27
  text "GND" at 33.57,20.15 h1.27
  text "GND" at 36.11,20.15 h1.27
  text "GND" at 23.41,20.15 h1.27
  text "GND" at 25.95,20.15 h1.27
  text "GND" at 28.49,20.15 h1.27
  text "GND" at 15.79,20.15 h1.27
  text "GND" at 18.33,20.15 h1.27
  text "GND" at 20.87,20.15 h1.27
  text "GND" at 8.17,20.15 h1.27
  text "GND" at 10.71,20.15 h1.27
  text "GND" at 13.25,20.15 h1.27
  text "GND" at 5.63,20.15 h1.27
  text "GND" at 3.09,20.15 h1.27
  text "GND" at 0.55,20.15 h1.27
3D body: height 5.7, standoff -2.58, extent -2.125,-0.165 50.325,15.325

## DIP600-40N [mm] "DIP, Plastic; 40 Leads; Row Spacing 15.24 mm; Pitch 2.54 mm"
height 4.83
pads (40):
  rect 1.5x1.5 hole 0.9: 1(0,0)
  round 1.5 hole 0.9: 2(2.54,0) 3(5.08,0) 4(7.62,0) 5(10.16,0) 6(12.7,0) 7(15.24,0) 8(17.78,0) 9(20.32,0) 10(22.86,0) 11(25.4,0) 12(27.94,0) 13(30.48,0) 14(33.02,0) 15(35.56,0) 16(38.1,0) 17(40.64,0) 18(43.18,0) 19(45.72,0) 20(48.26,0) 21(48.26,15.24) 22(45.72,15.24) 23(43.18,15.24) 24(40.64,15.24) 25(38.1,15.24) 26(35.56,15.24) 27(33.02,15.24) 28(30.48,15.24) 29(27.94,15.24) 30(25.4,15.24) 31(22.86,15.24) 32(20.32,15.24) 33(17.78,15.24) 34(15.24,15.24) 35(12.7,15.24) 36(10.16,15.24) 37(7.62,15.24) 38(5.08,15.24) 39(2.54,15.24) 40(0,15.24)
Top Overlay:
  lines w0.2: -2.37,1.17 50.63,1.17 50.63,14.07 -2.37,14.07 -2.37,8.255 cw(c-2.37,7.62) -2.37,6.985 -2.37,1.17
3D body: height 5.7, standoff -2.58, extent -2.125,-0.165 50.325,15.325

## DIP-4 [mm] "DIP, 4-Pin, Row Spacing 7.62 mm, Pitch 2.54 mm"
height 4.57
pads (4):
  rect 1.5x1.5 hole 0.813: 1(-3.81,1.27)
  round 1.5 hole 0.813: 2(-3.81,-1.27) 3(3.81,-1.27) 4(3.81,1.27)
Top Overlay:
  circle w0.25: c-3.81,2.57 r0.125
  circle w0.6: c-1.65,1.55 r0.3
  lines w0.2: -2.65,-2.55 -2.65,2.55 -0.635,2.55 ccw(c0,2.55) 0.635,2.55 2.65,2.55 2.65,-2.55 -2.65,-2.55
Mechanical 13:
  circle w0.1: c-2.25,1.6 r0.5
  lines w0.1: -3.15,-2.5 -3.15,2.5 3.15,2.5 3.15,-2.5 -3.15,-2.5
Mechanical 15:
  lines w0.1: -0.5,0 0.5,0 ; 0,-0.5 0,0.5
3D body: height 4.31, standoff -3.28, extent -4,-2.77 4,2.77

## DIP-6 [mm] "DIP, 6-Pin, Row Spacing 7.62 mm, Pitch 2.54 mm"
height 5.46
pads (6):
  rect 1.5x1.5 hole 0.813: 1(-3.81,2.54)
  round 1.5 hole 0.813: 2(-3.81,0) 3(-3.81,-2.54) 4(3.81,-2.54) 5(3.81,0) 6(3.81,2.54)
Top Overlay:
  circle w0.6: c-1.65,3.7 r0.3
  circle w0.25: c-3.81,3.84 r0.125
  lines w0.2: -2.65,-4.7 2.65,-4.7 2.65,4.7 0.635,4.7 cw(c0,4.7) -0.635,4.7 -2.65,4.7 -2.65,-4.7
Mechanical 13:
  circle w0.1: c-2.65,3.8 r0.5
  lines w0.1: -3.55,-4.7 3.55,-4.7 3.55,4.7 -3.55,4.7 -3.55,-4.7
Mechanical 15:
  lines w0.1: -0.5,0 0.5,0 ; 0,-0.5 0,0.5
3D body: height 5.22, standoff -2.57, extent -3.937,-4.406 3.943,4.394

## DIP-8 [mm] "DIP, 8-Pin, Row Spacing 7.62 mm, Pitch 2.54 mm"
height 5.33
pads (8):
  rect 1.5x1.5 hole 0.813: 1(-3.81,3.81)
  round 1.5 hole 0.813: 2(-3.81,1.27) 3(-3.81,-1.27) 4(-3.81,-3.81) 5(3.81,-3.81) 6(3.81,-1.27) 7(3.81,1.27) 8(3.81,3.81)
Top Overlay:
  circle w0.6: c-1.65,4.15 r0.3
  circle w0.25: c-3.81,5.11 r0.125
  lines w0.2: -2.65,-5.15 2.65,-5.15 2.65,5.15 0.635,5.15 cw(c0,5.15) -0.635,5.15 -2.65,5.15 -2.65,-5.15
Mechanical 13:
  circle w0.1: c-2.7,4.25 r0.5
  lines w0.1: -3.6,-5.15 3.6,-5.15 3.6,5.15 -3.6,5.15 -3.6,-5.15
Mechanical 15:
  lines w0.1: -0.5,0 0.5,0 ; 0,-0.5 0,0.5
3D body: height 4.57, standoff -3.81, extent -3.912,-4.954 3.908,4.956

## DIP-14 [mm] "DIP, 14-Pin, Row Spacing 7.62 mm, Pitch 2.54 mm"
height 5.08
pads (14):
  rect 1.5x1.5 hole 0.813: 1(-3.81,7.62)
  round 1.5 hole 0.813: 2(-3.81,5.08) 3(-3.81,2.54) 4(-3.81,0) 5(-3.81,-2.54) 6(-3.81,-5.08) 7(-3.81,-7.62) 8(3.81,-7.62) 9(3.81,-5.08) 10(3.81,-2.54) 11(3.81,0) 12(3.81,2.54) 13(3.81,5.08) 14(3.81,7.62)
Top Overlay:
  circle w0.25: c-3.81,8.92 r0.125
  circle w0.6: c-1.65,9.1 r0.3
  lines w0.2: -2.65,-10.1 -2.65,10.1 -0.635,10.1 ccw(c0,10.1) 0.635,10.1 2.65,10.1 2.65,-10.1 -2.65,-10.1
Mechanical 13:
  circle w0.1: c-2.7,9.2 r0.5
  lines w0.1: -3.6,-10.1 -3.6,10.1 3.6,10.1 3.6,-10.1 -3.6,-10.1
Mechanical 15:
  lines w0.1: -0.5,0 0.5,0 ; 0,-0.5 0,0.5
3D body: height 5.1, standoff -3.3, extent -3.935,-9.987 3.935,10.013

## DIP-16 [mm] "DIP, 16-Pin, Row Spacing 7.62 mm, Pitch 2.54 mm"
height 5.08
pads (16):
  rect 1.5x1.5 hole 0.813: 1(-3.81,8.89)
  round 1.5 hole 0.813: 2(-3.81,6.35) 3(-3.81,3.81) 4(-3.81,1.27) 5(-3.81,-1.27) 6(-3.81,-3.81) 7(-3.81,-6.35) 8(-3.81,-8.89) 9(3.81,-8.89) 10(3.81,-6.35) 11(3.81,-3.81) 12(3.81,-1.27) 13(3.81,1.27) 14(3.81,3.81) 15(3.81,6.35) 16(3.81,8.89)
Top Overlay:
  circle w0.25: c-3.81,10.19 r0.125
  circle w0.6: c-1.65,9.3 r0.3
  lines w0.2: -2.65,-10.3 -2.65,10.3 -0.635,10.3 ccw(c0,10.3) 0.635,10.3 2.65,10.3 2.65,-10.3 -2.65,-10.3
Mechanical 13:
  circle w0.1: c-2.7,9.375 r0.5
  lines w0.1: -3.6,-10.275 -3.6,10.275 3.6,10.275 3.6,-10.275 -3.6,-10.275
Mechanical 15:
  lines w0.1: -0.5,0 0.5,0 ; 0,-0.5 0,0.5
3D body: height 5.1, standoff -3.3, extent -3.935,-10.165 3.935,9.835

## DIP-18 [mm] "DIP, 18-Pin, Row Spacing 7.62 mm, Pitch 2.54 mm"
height 5.33
pads (18):
  rect 1.5x1.5 hole 0.813: 1(-3.81,10.16)
  round 1.5 hole 0.813: 2(-3.81,7.62) 3(-3.81,5.08) 4(-3.81,2.54) 5(-3.81,0) 6(-3.81,-2.54) 7(-3.81,-5.08) 8(-3.81,-7.62) 9(-3.81,-10.16) 10(3.81,-10.16) 11(3.81,-7.62) 12(3.81,-5.08) 13(3.81,-2.54) 14(3.81,0) 15(3.81,2.54) 16(3.81,5.08) 17(3.81,7.62) 18(3.81,10.16)
Top Overlay:
  circle w0.6: c-1.65,10.85 r0.3
  circle w0.25: c-3.81,11.46 r0.125
  lines w0.2: -2.65,-11.85 2.65,-11.85 2.65,11.85 0.635,11.85 cw(c0,11.85) -0.635,11.85 -2.65,11.85 -2.65,-11.85
Mechanical 13:
  circle w0.1: c-2.7,10.9 r0.5
  lines w0.1: -3.6,-11.8 3.6,-11.8 3.6,11.8 -3.6,11.8 -3.6,-11.8
Mechanical 15:
  lines w0.1: -0.5,0 0.5,0 ; 0,-0.5 0,0.5
3D body: height 4.57, standoff -3.81, extent -3.91,-11.62 3.91,11.62

## DIP-20 [mm] "DIP, 20-Pin, Row Spacing 7.62 mm, Pitch 2.54 mm"
height 5.08
pads (20):
  rect 1.5x1.5 hole 0.813: 1(-3.81,11.43)
  round 1.5 hole 0.813: 2(-3.81,8.89) 3(-3.81,6.35) 4(-3.81,3.81) 5(-3.81,1.27) 6(-3.81,-1.27) 7(-3.81,-3.81) 8(-3.81,-6.35) 9(-3.81,-8.89) 10(-3.81,-11.43) 11(3.81,-11.43) 12(3.81,-8.89) 13(3.81,-6.35) 14(3.81,-3.81) 15(3.81,-1.27) 16(3.81,1.27) 17(3.81,3.81) 18(3.81,6.35) 19(3.81,8.89) 20(3.81,11.43)
Top Overlay:
  circle w0.25: c-3.81,12.73 r0.125
  circle w0.6: c-1.65,12 r0.3
  lines w0.2: -2.65,-13 -2.65,13 -0.635,13 ccw(c0,13) 0.635,13 2.65,13 2.65,-13 -2.65,-13
Mechanical 13:
  circle w0.1: c-2.7,12.05 r0.5
  lines w0.1: -3.6,-12.95 -3.6,12.95 3.6,12.95 3.6,-12.95 -3.6,-12.95
Mechanical 15:
  lines w0.1: -0.5,0 0.5,0 ; 0,-0.5 0,0.5
3D body: height 4.57, standoff -3.81, extent -3.91,-13.27 3.91,13.27

## DIP-24N [mm] "DIP, 24-Pin, Row Spacing 7.62 mm, Pitch 2.54 mm"
height 4.06
pads (24):
  rect 1.5x1.5 hole 0.813: 1(-3.81,13.97)
  round 1.5 hole 0.813: 2(-3.81,11.43) 3(-3.81,8.89) 4(-3.81,6.35) 5(-3.81,3.81) 6(-3.81,1.27) 7(-3.81,-1.27) 8(-3.81,-3.81) 9(-3.81,-6.35) 10(-3.81,-8.89) 11(-3.81,-11.43) 12(-3.81,-13.97) 13(3.81,-13.97) 14(3.81,-11.43) 15(3.81,-8.89) 16(3.81,-6.35) 17(3.81,-3.81) 18(3.81,-1.27) 19(3.81,1.27) 20(3.81,3.81) 21(3.81,6.35) 22(3.81,8.89) 23(3.81,11.43) 24(3.81,13.97)
Top Overlay:
  circle w0.6: c-1.65,14.5 r0.3
  circle w0.25: c-3.81,15.27 r0.125
  lines w0.2: -2.65,-15.5 2.65,-15.5 2.65,15.5 0.635,15.5 cw(c0,15.5) -0.635,15.5 -2.65,15.5 -2.65,-15.5
Mechanical 13:
  circle w0.1: c-2.675,14.6 r0.5
  lines w0.1: -3.575,-15.5 3.575,-15.5 3.575,15.5 -3.575,15.5 -3.575,-15.5
Mechanical 15:
  lines w0.1: -0.5,0 0.5,0 ; 0,-0.5 0,0.5
3D body: height 4.19, standoff -2.57, extent -4.064,-15.875 4.318,15.875

## DIP-28N [mm] "DIP, 28-Pin, Row Spacing 7.62 mm, Pitch 2.54 mm"
height 5.33
pads (28):
  rect 1.5x1.5 hole 0.813: 1(-3.81,16.51)
  round 1.5 hole 0.813: 2(-3.81,13.97) 3(-3.81,11.43) 4(-3.81,8.89) 5(-3.81,6.35) 6(-3.81,3.81) 7(-3.81,1.27) 8(-3.81,-1.27) 9(-3.81,-3.81) 10(-3.81,-6.35) 11(-3.81,-8.89) 12(-3.81,-11.43) 13(-3.81,-13.97) 14(-3.81,-16.51) 15(3.81,-16.51) 16(3.81,-13.97) 17(3.81,-11.43) 18(3.81,-8.89) 19(3.81,-6.35) 20(3.81,-3.81) 21(3.81,-1.27) 22(3.81,1.27) 23(3.81,3.81) 24(3.81,6.35) 25(3.81,8.89) 26(3.81,11.43) 27(3.81,13.97) 28(3.81,16.51)
Top Overlay:
  circle w0.6: c-1.65,17.1 r0.3
  circle w0.25: c-3.81,17.81 r0.125
  lines w0.2: -2.65,-18.1 2.65,-18.1 2.65,18.1 0.635,18.1 cw(c0,18.1) -0.635,18.1 -2.65,18.1 -2.65,-18.1
Mechanical 13:
  circle w0.1: c-2.65,17.2 r0.5
  lines w0.1: -3.55,-18.1 3.55,-18.1 3.55,18.1 -3.55,18.1 -3.55,-18.1
Mechanical 15:
  lines w0.1: -0.5,0 0.5,0 ; 0,-0.5 0,0.5
3D body: height 4.65, standoff -1.57, extent -3.937,-17.971 3.937,17.97

## DIP-28W [mm] "DIP; 28 Leads; Row Spacing 15.24 mm; Pitch 2.54 mm"
height 5.72
pads (28):
  rect 1.5x1.5 hole 0.9: 1(-16.51,-7.62)
  round 1.5 hole 0.9: 2(-13.97,-7.62) 3(-11.43,-7.62) 4(-8.89,-7.62) 5(-6.35,-7.62) 6(-3.81,-7.62) 7(-1.27,-7.62) 8(1.27,-7.62) 9(3.81,-7.62) 10(6.35,-7.62) 11(8.89,-7.62) 12(11.43,-7.62) 13(13.97,-7.62) 14(16.51,-7.62) 15(16.51,7.62) 16(13.97,7.62) 17(11.43,7.62) 18(8.89,7.62) 19(6.35,7.62) 20(3.81,7.62) 21(1.27,7.62) 22(-1.27,7.62) 23(-3.81,7.62) 24(-6.35,7.62) 25(-8.89,7.62) 26(-11.43,7.62) 27(-13.97,7.62) 28(-16.51,7.62)
Top Overlay:
  lines w0.2: -19.05,-6.45 -19.05,-0.635 ccw(c-19.05,0) -19.05,0.635 -19.05,6.45 19.05,6.45 19.05,-6.45 -19.05,-6.45
3D body: height 4.66, standoff -3.28, extent -18.01,-7.81 18,7.81

## DIP-32 [mm] "DIP, Plastic, 32-Pin, Row Spacing 10.16 mm, Pitch 2.54 mm"
height 5.34
pads (32):
  rect 1.5x1.5 hole 0.813: 1(-5.08,19.05)
  round 1.5 hole 0.813: 2(-5.08,16.51) 3(-5.08,13.97) 4(-5.08,11.43) 5(-5.08,8.89) 6(-5.08,6.35) 7(-5.08,3.81) 8(-5.08,1.27) 9(-5.08,-1.27) 10(-5.08,-3.81) 11(-5.08,-6.35) 12(-5.08,-8.89) 13(-5.08,-11.43) 14(-5.08,-13.97) 15(-5.08,-16.51) 16(-5.08,-19.05) 17(5.08,-19.05) 18(5.08,-16.51) 19(5.08,-13.97) 20(5.08,-11.43) 21(5.08,-8.89) 22(5.08,-6.35) 23(5.08,-3.81) 24(5.08,-1.27) 25(5.08,1.27) 26(5.08,3.81) 27(5.08,6.35) 28(5.08,8.89) 29(5.08,11.43) 30(5.08,13.97) 31(5.08,16.51) 32(5.08,19.05)
Top Overlay:
  circle w0.6: c-2.9,19.6 r0.3
  circle w0.25: c-5.08,20.35 r0.125
  lines w0.2: -3.9,-20.6 3.9,-20.6 3.9,20.6 0.635,20.6 cw(c0,20.6) -0.635,20.6 -3.9,20.6 -3.9,-20.6
Mechanical 13:
  circle w0.1: c-3.975,19.675 r0.5
  lines w0.1: -4.875,-20.575 4.875,-20.575 4.875,20.575 -4.875,20.575 -4.875,-20.575
Mechanical 15:
  lines w0.1: -0.5,0 0.5,0 ; 0,-0.5 0,0.5